# Altium schematic symbol library jlcpcb_2025_04_resistors_extended_2512.schlib: 2667 symbols (part 9 of 14) (continued)
## RC2512FK-7W33RL
designator R?  Resistance: 33Ω  (hidden comment: *)
Resistor, 33Ω, ±1%, 2W, 200V, ±200ppm/℃, -55℃~+155℃, SMD 2512; Manufacturer: Uniroyal; Manufacturer Part Number: RC2512FK-7W33RL; Supplier 1: LCSC; Supplier Part Number 1: C723367; JLCPCB Part Number: C723367; Power Rating: 2W; Category: Resistors; Package Size: 2512; JLCPCB Basic Part: Yes; Tolerance: ±1%; Voltage Rating: 200V; Temperature Coefficient: ±200ppm/℃; Temperature Rating: -55℃~+155℃; ComponentLink1Description: Datasheet; ComponentLink1URL: https://wmsc.lcsc.com/wmsc/upload/file/pdf/v2/lcsc/2008171304_YAGEO-RC2512FK-7W33RL_C723367.pdf; ComponentLink2Description: JLCPCB Part URL; ComponentLink2URL: https://jlcpcb.com/partdetail/C723367
pins: 1, 2
1 alternate drawing of the same symbol

## RC2512FK-7W49R9L
designator R?  Resistance: 49.9Ω  (hidden comment: *)
Resistor, 49.9Ω, ±1%, 2W, ±100ppm/℃, -55℃~+155℃, SMD 2512; Manufacturer: Uniroyal; Manufacturer Part Number: RC2512FK-7W49R9L; Supplier 1: LCSC; Supplier Part Number 1: C723714; JLCPCB Part Number: C723714; Power Rating: 2W; Category: Resistors; Package Size: 2512; JLCPCB Basic Part: Yes; Tolerance: ±1%; Temperature Coefficient: ±100ppm/℃; Temperature Rating: -55℃~+155℃; ComponentLink1Description: Datasheet; ComponentLink1URL: https://wmsc.lcsc.com/wmsc/upload/file/pdf/v2/lcsc/2008171337_YAGEO-RC2512FK-7W49R9L_C723714.pdf; ComponentLink2Description: JLCPCB Part URL; ComponentLink2URL: https://jlcpcb.com/partdetail/C723714
pins: 1, 2
1 alternate drawing of the same symbol

## RC2512FK-7W51RL
designator R?  Resistance: 51Ω  (hidden comment: *)
Resistor, 51Ω, ±1%, 2W, 200V, ±100ppm/℃, -55℃~+155℃, SMD 2512; Manufacturer: Uniroyal; Manufacturer Part Number: RC2512FK-7W51RL; Supplier 1: LCSC; Supplier Part Number 1: C326579; JLCPCB Part Number: C326579; Power Rating: 2W; Category: Resistors; Package Size: 2512; JLCPCB Basic Part: Yes; Tolerance: ±1%; Voltage Rating: 200V; Temperature Coefficient: ±100ppm/℃; Temperature Rating: -55℃~+155℃; ComponentLink1Description: Datasheet; ComponentLink1URL: https://wmsc.lcsc.com/wmsc/upload/file/pdf/v2/lcsc/1811141450_YAGEO-RC2512FK-7W51RL_C326579.pdf; ComponentLink2Description: JLCPCB Part URL; ComponentLink2URL: https://jlcpcb.com/partdetail/C326579
pins: 1, 2
1 alternate drawing of the same symbol

## RC2512FK-7W91RL
designator R?  Resistance: 91Ω  (hidden comment: *)
Resistor, 91Ω, ±1%, 2W, ±100ppm/℃, -55℃~+155℃, SMD 2512; Manufacturer: Uniroyal; Manufacturer Part Number: RC2512FK-7W91RL; Supplier 1: LCSC; Supplier Part Number 1: C723627; JLCPCB Part Number: C723627; Power Rating: 2W; Category: Resistors; Package Size: 2512; JLCPCB Basic Part: Yes; Tolerance: ±1%; Temperature Coefficient: ±100ppm/℃; Temperature Rating: -55℃~+155℃; ComponentLink1Description: Datasheet; ComponentLink1URL: https://wmsc.lcsc.com/wmsc/upload/file/pdf/v2/lcsc/2008201236_YAGEO-RC2512FK-7W91RL_C723627.pdf; ComponentLink2Description: JLCPCB Part URL; ComponentLink2URL: https://jlcpcb.com/partdetail/C723627
pins: 1, 2
1 alternate drawing of the same symbol

## RC2512FK-7W100KL
designator R?  Resistance: 100kΩ  (hidden comment: *)
Resistor, 100kΩ, ±1%, 2W, ±200ppm/℃, -55℃~+155℃, SMD 2512; Manufacturer: Uniroyal; Manufacturer Part Number: RC2512FK-7W100KL; Supplier 1: LCSC; Supplier Part Number 1: C6170372; JLCPCB Part Number: C6170372; Power Rating: 2W; Category: Resistors; Package Size: 2512; JLCPCB Basic Part: Yes; Tolerance: ±1%; Temperature Coefficient: ±200ppm/℃; Temperature Rating: -55℃~+155℃; ComponentLink1Description: Datasheet; ComponentLink1URL: https://wmsc.lcsc.com/wmsc/upload/file/pdf/v2/lcsc/2312081307_YAGEO-RC2512FK-7W100KL_C6170372.pdf; ComponentLink2Description: JLCPCB Part URL; ComponentLink2URL: https://jlcpcb.com/partdetail/C6170372
pins: 1, 2
1 alternate drawing of the same symbol

## RC2512FK-071K2L
designator R?  Resistance: 1.2kΩ  (hidden comment: *)
Resistor, 1.2kΩ, ±1%, 1W, 200V, ±100ppm/℃, -55℃~+155℃, SMD 2512; Manufacturer: Uniroyal; Manufacturer Part Number: RC2512FK-071K2L; Supplier 1: LCSC; Supplier Part Number 1: C877804; JLCPCB Part Number: C877804; Power Rating: 1W; Category: Resistors; Package Size: 2512; JLCPCB Basic Part: Yes; Tolerance: ±1%; Voltage Rating: 200V; Temperature Coefficient: ±100ppm/℃; Temperature Rating: -55℃~+155℃; ComponentLink1Description: Datasheet; ComponentLink1URL: https://wmsc.lcsc.com/wmsc/upload/file/pdf/v2/lcsc/2112231430_YAGEO-RC2512FK-071K2L_C877804.pdf; ComponentLink2Description: JLCPCB Part URL; ComponentLink2URL: https://jlcpcb.com/partdetail/C877804
pins: 1, 2
1 alternate drawing of the same symbol

## RC2512FK-071K4L
designator R?  Resistance: 1.4kΩ  (hidden comment: *)
Resistor, 1.4kΩ, ±1%, 1W, 200V, ±100ppm/℃, -55℃~+155℃, SMD 2512; Manufacturer: Uniroyal; Manufacturer Part Number: RC2512FK-071K4L; Supplier 1: LCSC; Supplier Part Number 1: C877810; JLCPCB Part Number: C877810; Power Rating: 1W; Category: Resistors; Package Size: 2512; JLCPCB Basic Part: Yes; Tolerance: ±1%; Voltage Rating: 200V; Temperature Coefficient: ±100ppm/℃; Temperature Rating: -55℃~+155℃; ComponentLink1Description: Datasheet; ComponentLink1URL: https://wmsc.lcsc.com/wmsc/upload/file/pdf/v2/lcsc/2202251630_YAGEO-RC2512FK-071K4L_C877810.pdf; ComponentLink2Description: JLCPCB Part URL; ComponentLink2URL: https://jlcpcb.com/partdetail/C877810
pins: 1, 2
1 alternate drawing of the same symbol

## RC2512FK-071K5L
designator R?  Resistance: 1.5kΩ  (hidden comment: *)
Resistor, 1.5kΩ, ±1%, 1W, 200V, ±100ppm/℃, -55℃~+155℃, SMD 2512; Manufacturer: Uniroyal; Manufacturer Part Number: RC2512FK-071K5L; Supplier 1: LCSC; Supplier Part Number 1: C276334; JLCPCB Part Number: C276334; Power Rating: 1W; Category: Resistors; Package Size: 2512; JLCPCB Basic Part: Yes; Tolerance: ±1%; Voltage Rating: 200V; Temperature Coefficient: ±100ppm/℃; Temperature Rating: -55℃~+155℃; ComponentLink1Description: Datasheet; ComponentLink1URL: https://wmsc.lcsc.com/wmsc/upload/file/pdf/v2/lcsc/2304140030_YAGEO-RC2512FK-071K5L_C276334.pdf; ComponentLink2Description: JLCPCB Part URL; ComponentLink2URL: https://jlcpcb.com/partdetail/C276334
pins: 1, 2
1 alternate drawing of the same symbol

## RC2512FK-071ML
designator R?  Resistance: 1MΩ  (hidden comment: *)
Resistor, 1MΩ, ±1%, 1W, 200V, ±100ppm/℃, -55℃~+155℃, SMD 2512; Manufacturer: Uniroyal; Manufacturer Part Number: RC2512FK-071ML; Supplier 1: LCSC; Supplier Part Number 1: C276335; JLCPCB Part Number: C276335; Power Rating: 1W; Category: Resistors; Package Size: 2512; JLCPCB Basic Part: Yes; Tolerance: ±1%; Voltage Rating: 200V; Temperature Coefficient: ±100ppm/℃; Temperature Rating: -55℃~+155℃; ComponentLink1Description: Datasheet; ComponentLink1URL: https://wmsc.lcsc.com/wmsc/upload/file/pdf/v2/lcsc/2304140030_YAGEO-RC2512FK-071ML_C276335.pdf; ComponentLink2Description: JLCPCB Part URL; ComponentLink2URL: https://jlcpcb.com/partdetail/C276335
pins: 1, 2
1 alternate drawing of the same symbol

## RC2512FK-071R1L
designator R?  Resistance: 1.1Ω  (hidden comment: *)
Resistor, 1.1Ω, ±1%, 1W, ±200ppm/℃, -55℃~+155℃, SMD 2512; Manufacturer: Uniroyal; Manufacturer Part Number: RC2512FK-071R1L; Supplier 1: LCSC; Supplier Part Number 1: C877832; JLCPCB Part Number: C877832; Power Rating: 1W; Category: Resistors; Package Size: 2512; JLCPCB Basic Part: Yes; Tolerance: ±1%; Temperature Coefficient: ±200ppm/℃; Temperature Rating: -55℃~+155℃; ComponentLink1Description: Datasheet; ComponentLink1URL: https://wmsc.lcsc.com/wmsc/upload/file/pdf/v2/lcsc/2210202330_YAGEO-RC2512FK-071R1L_C877832.pdf; ComponentLink2Description: JLCPCB Part URL; ComponentLink2URL: https://jlcpcb.com/partdetail/C877832
pins: 1, 2
1 alternate drawing of the same symbol

## RC2512FK-071R2L
designator R?  Resistance: 1.2Ω  (hidden comment: *)
Resistor, 1.2Ω, ±1%, 1W, 200V, ±200ppm/℃, -55℃~+155℃, SMD 2512; Manufacturer: Uniroyal; Manufacturer Part Number: RC2512FK-071R2L; Supplier 1: LCSC; Supplier Part Number 1: C877834; JLCPCB Part Number: C877834; Power Rating: 1W; Category: Resistors; Package Size: 2512; JLCPCB Basic Part: Yes; Tolerance: ±1%; Voltage Rating: 200V; Temperature Coefficient: ±200ppm/℃; Temperature Rating: -55℃~+155℃; ComponentLink1Description: Datasheet; ComponentLink1URL: https://wmsc.lcsc.com/wmsc/upload/file/pdf/v2/lcsc/2304140030_YAGEO-RC2512FK-071R2L_C877834.pdf; ComponentLink2Description: JLCPCB Part URL; ComponentLink2URL: https://jlcpcb.com/partdetail/C877834
pins: 1, 2
1 alternate drawing of the same symbol

## RC2512FK-071R5L
designator R?  Resistance: 1.5Ω  (hidden comment: *)
Resistor, 1.5Ω, ±1%, 1W, 200V, ±200ppm/℃, -55℃~+155℃, SMD 2512; Manufacturer: Uniroyal; Manufacturer Part Number: RC2512FK-071R5L; Supplier 1: LCSC; Supplier Part Number 1: C181757; JLCPCB Part Number: C181757; Power Rating: 1W; Category: Resistors; Package Size: 2512; JLCPCB Basic Part: Yes; Tolerance: ±1%; Voltage Rating: 200V; Temperature Coefficient: ±200ppm/℃; Temperature Rating: -55℃~+155℃; ComponentLink1Description: Datasheet; ComponentLink1URL: https://wmsc.lcsc.com/wmsc/upload/file/pdf/v2/lcsc/1810271823_YAGEO-RC2512FK-071R5L_C181757.pdf; ComponentLink2Description: JLCPCB Part URL; ComponentLink2URL: https://jlcpcb.com/partdetail/C181757
pins: 1, 2
1 alternate drawing of the same symbol

## RC2512FK-071RL
designator R?  Resistance: 1Ω  (hidden comment: *)
Resistor, 1Ω, ±1%, 1W, 200V, ±200ppm/℃, -55℃~+155℃, SMD 2512; Manufacturer: Uniroyal; Manufacturer Part Number: RC2512FK-071RL; Supplier 1: LCSC; Supplier Part Number 1: C181756; JLCPCB Part Number: C181756; Power Rating: 1W; Category: Resistors; Package Size: 2512; JLCPCB Basic Part: Yes; Tolerance: ±1%; Voltage Rating: 200V; Temperature Coefficient: ±200ppm/℃; Temperature Rating: -55℃~+155℃; ComponentLink1Description: Datasheet; ComponentLink1URL: https://wmsc.lcsc.com/wmsc/upload/file/pdf/v2/lcsc/2304140030_YAGEO-RC2512FK-071RL_C181756.pdf; ComponentLink2Description: JLCPCB Part URL; ComponentLink2URL: https://jlcpcb.com/partdetail/C181756
pins: 1, 2
1 alternate drawing of the same symbol

## RC2512FK-072K7L
designator R?  Resistance: 2.7kΩ  (hidden comment: *)
Resistor, 2.7kΩ, ±1%, 1W, 200V, ±100ppm/℃, -55℃~+155℃, SMD 2512; Manufacturer: Uniroyal; Manufacturer Part Number: RC2512FK-072K7L; Supplier 1: LCSC; Supplier Part Number 1: C877933; JLCPCB Part Number: C877933; Power Rating: 1W; Category: Resistors; Package Size: 2512; JLCPCB Basic Part: Yes; Tolerance: ±1%; Voltage Rating: 200V; Temperature Coefficient: ±100ppm/℃; Temperature Rating: -55℃~+155℃; ComponentLink1Description: Datasheet; ComponentLink1URL: https://wmsc.lcsc.com/wmsc/upload/file/pdf/v2/lcsc/2201101800_YAGEO-RC2512FK-072K7L_C877933.pdf; ComponentLink2Description: JLCPCB Part URL; ComponentLink2URL: https://jlcpcb.com/partdetail/C877933
pins: 1, 2
1 alternate drawing of the same symbol

## RC2512FK-072KL
designator R?  Resistance: 2kΩ  (hidden comment: *)
Resistor, 2kΩ, ±1%, 1W, 200V, ±100ppm/℃, -55℃~+155℃, SMD 2512; Manufacturer: Uniroyal; Manufacturer Part Number: RC2512FK-072KL; Supplier 1: LCSC; Supplier Part Number 1: C276337; JLCPCB Part Number: C276337; Power Rating: 1W; Category: Resistors; Package Size: 2512; JLCPCB Basic Part: Yes; Tolerance: ±1%; Voltage Rating: 200V; Temperature Coefficient: ±100ppm/℃; Temperature Rating: -55℃~+155℃; ComponentLink1Description: Datasheet; ComponentLink1URL: https://wmsc.lcsc.com/wmsc/upload/file/pdf/v2/lcsc/2304140030_YAGEO-RC2512FK-072KL_C276337.pdf; ComponentLink2Description: JLCPCB Part URL; ComponentLink2URL: https://jlcpcb.com/partdetail/C276337
pins: 1, 2
1 alternate drawing of the same symbol

## RC2512FK-072ML
designator R?  Resistance: 2MΩ  (hidden comment: *)
Resistor, 2MΩ, ±1%, 1W, 200V, ±100ppm/℃, -55℃~+155℃, SMD 2512; Manufacturer: Uniroyal; Manufacturer Part Number: RC2512FK-072ML; Supplier 1: LCSC; Supplier Part Number 1: C723722; JLCPCB Part Number: C723722; Power Rating: 1W; Category: Resistors; Package Size: 2512; JLCPCB Basic Part: Yes; Tolerance: ±1%; Voltage Rating: 200V; Temperature Coefficient: ±100ppm/℃; Temperature Rating: -55℃~+155℃; ComponentLink1Description: Datasheet; ComponentLink1URL: https://wmsc.lcsc.com/wmsc/upload/file/pdf/v2/lcsc/2008171337_YAGEO-RC2512FK-072ML_C723722.pdf; ComponentLink2Description: JLCPCB Part URL; ComponentLink2URL: https://jlcpcb.com/partdetail/C723722
pins: 1, 2
1 alternate drawing of the same symbol

## RC2512FK-072R2L
designator R?  Resistance: 2.2Ω  (hidden comment: *)
Resistor, 2.2Ω, ±1%, 1W, 200V, ±200ppm/℃, -55℃~+155℃, SMD 2512; Manufacturer: Uniroyal; Manufacturer Part Number: RC2512FK-072R2L; Supplier 1: LCSC; Supplier Part Number 1: C137028; JLCPCB Part Number: C137028; Power Rating: 1W; Category: Resistors; Package Size: 2512; JLCPCB Basic Part: Yes; Tolerance: ±1%; Voltage Rating: 200V; Temperature Coefficient: ±200ppm/℃; Temperature Rating: -55℃~+155℃; ComponentLink1Description: Datasheet; ComponentLink1URL: https://wmsc.lcsc.com/wmsc/upload/file/pdf/v2/lcsc/2304140030_YAGEO-RC2512FK-072R2L_C137028.pdf; ComponentLink2Description: JLCPCB Part URL; ComponentLink2URL: https://jlcpcb.com/partdetail/C137028
pins: 1, 2
1 alternate drawing of the same symbol

## RC2512FK-072R4L
designator R?  Resistance: 2.4Ω  (hidden comment: *)
Resistor, 2.4Ω, ±1%, 1W, 200V, ±200ppm/℃, -55℃~+155℃, SMD 2512; Manufacturer: Uniroyal; Manufacturer Part Number: RC2512FK-072R4L; Supplier 1: LCSC; Supplier Part Number 1: C326564; JLCPCB Part Number: C326564; Power Rating: 1W; Category: Resistors; Package Size: 2512; JLCPCB Basic Part: Yes; Tolerance: ±1%; Voltage Rating: 200V; Temperature Coefficient: ±200ppm/℃; Temperature Rating: -55℃~+155℃; ComponentLink1Description: Datasheet; ComponentLink1URL: https://wmsc.lcsc.com/wmsc/upload/file/pdf/v2/lcsc/1811141450_YAGEO-RC2512FK-072R4L_C326564.pdf; ComponentLink2Description: JLCPCB Part URL; ComponentLink2URL: https://jlcpcb.com/partdetail/C326564
pins: 1, 2
1 alternate drawing of the same symbol

## RC2512FK-072RL
designator R?  Resistance: 2Ω  (hidden comment: *)
Resistor, 2Ω, ±1%, 1W, 200V, ±200ppm/℃, -55℃~+155℃, SMD 2512; Manufacturer: Uniroyal; Manufacturer Part Number: RC2512FK-072RL; Supplier 1: LCSC; Supplier Part Number 1: C136027; JLCPCB Part Number: C136027; Power Rating: 1W; Category: Resistors; Package Size: 2512; JLCPCB Basic Part: Yes; Tolerance: ±1%; Voltage Rating: 200V; Temperature Coefficient: ±200ppm/℃; Temperature Rating: -55℃~+155℃; ComponentLink1Description: Datasheet; ComponentLink1URL: https://wmsc.lcsc.com/wmsc/upload/file/pdf/v2/lcsc/2304140030_YAGEO-RC2512FK-072RL_C136027.pdf; ComponentLink2Description: JLCPCB Part URL; ComponentLink2URL: https://jlcpcb.com/partdetail/C136027
pins: 1, 2
1 alternate drawing of the same symbol

## RC2512FK-073K3L
designator R?  Resistance: 3.3kΩ  (hidden comment: *)
Resistor, 3.3kΩ, ±1%, 1W, 200V, ±100ppm/℃, -55℃~+155℃, SMD 2512; Manufacturer: Uniroyal; Manufacturer Part Number: RC2512FK-073K3L; Supplier 1: LCSC; Supplier Part Number 1: C326620; JLCPCB Part Number: C326620; Power Rating: 1W; Category: Resistors; Package Size: 2512; JLCPCB Basic Part: Yes; Tolerance: ±1%; Voltage Rating: 200V; Temperature Coefficient: ±100ppm/℃; Temperature Rating: -55℃~+155℃; ComponentLink1Description: Datasheet; ComponentLink1URL: https://wmsc.lcsc.com/wmsc/upload/file/pdf/v2/lcsc/1811141450_YAGEO-RC2512FK-073K3L_C326620.pdf; ComponentLink2Description: JLCPCB Part URL; ComponentLink2URL: https://jlcpcb.com/partdetail/C326620
pins: 1, 2
1 alternate drawing of the same symbol

## RC2512FK-073K9L
designator R?  Resistance: 3.9kΩ  (hidden comment: *)
Resistor, 3.9kΩ, ±1%, 1W, 200V, ±100ppm/℃, -55℃~+155℃, SMD 2512; Manufacturer: Uniroyal; Manufacturer Part Number: RC2512FK-073K9L; Supplier 1: LCSC; Supplier Part Number 1: C326613; JLCPCB Part Number: C326613; Power Rating: 1W; Category: Resistors; Package Size: 2512; JLCPCB Basic Part: Yes; Tolerance: ±1%; Voltage Rating: 200V; Temperature Coefficient: ±100ppm/℃; Temperature Rating: -55℃~+155℃; ComponentLink1Description: Datasheet; ComponentLink1URL: https://wmsc.lcsc.com/wmsc/upload/file/pdf/v2/lcsc/1811141450_YAGEO-RC2512FK-073K9L_C326613.pdf; ComponentLink2Description: JLCPCB Part URL; ComponentLink2URL: https://jlcpcb.com/partdetail/C326613
pins: 1, 2
1 alternate drawing of the same symbol

## RC2512FK-073K32L
designator R?  Resistance: 3.32kΩ  (hidden comment: *)
Resistor, 3.32kΩ, ±1%, 1W, ±100ppm/℃, -55℃~+155℃, SMD 2512; Manufacturer: Uniroyal; Manufacturer Part Number: RC2512FK-073K32L; Supplier 1: LCSC; Supplier Part Number 1: C878008; JLCPCB Part Number: C878008; Power Rating: 1W; Category: Resistors; Package Size: 2512; JLCPCB Basic Part: Yes; Tolerance: ±1%; Temperature Coefficient: ±100ppm/℃; Temperature Rating: -55℃~+155℃; ComponentLink1Description: Datasheet; ComponentLink1URL: https://wmsc.lcsc.com/wmsc/upload/file/pdf/v2/lcsc/2210201700_YAGEO-RC2512FK-073K32L_C878008.pdf; ComponentLink2Description: JLCPCB Part URL; ComponentLink2URL: https://jlcpcb.com/partdetail/C878008
pins: 1, 2
1 alternate drawing of the same symbol

## RC2512FK-073R3L
designator R?  Resistance: 3.3Ω  (hidden comment: *)
Resistor, 3.3Ω, ±1%, 1W, 200V, ±200ppm/℃, -55℃~+155℃, SMD 2512; Manufacturer: Uniroyal; Manufacturer Part Number: RC2512FK-073R3L; Supplier 1: LCSC; Supplier Part Number 1: C513649; JLCPCB Part Number: C513649; Power Rating: 1W; Category: Resistors; Package Size: 2512; JLCPCB Basic Part: Yes; Tolerance: ±1%; Voltage Rating: 200V; Temperature Coefficient: ±200ppm/℃; Temperature Rating: -55℃~+155℃; ComponentLink1Description: Datasheet; ComponentLink1URL: https://wmsc.lcsc.com/wmsc/upload/file/pdf/v2/lcsc/2304140030_YAGEO-RC2512FK-073R3L_C513649.pdf; ComponentLink2Description: JLCPCB Part URL; ComponentLink2URL: https://jlcpcb.com/partdetail/C513649
pins: 1, 2
1 alternate drawing of the same symbol

## RC2512FK-073R9L
designator R?  Resistance: 3.9Ω  (hidden comment: *)
Resistor, 3.9Ω, ±1%, 1W, 200V, ±200ppm/℃, -55℃~+155℃, SMD 2512; Manufacturer: Uniroyal; Manufacturer Part Number: RC2512FK-073R9L; Supplier 1: LCSC; Supplier Part Number 1: C326563; JLCPCB Part Number: C326563; Power Rating: 1W; Category: Resistors; Package Size: 2512; JLCPCB Basic Part: Yes; Tolerance: ±1%; Voltage Rating: 200V; Temperature Coefficient: ±200ppm/℃; Temperature Rating: -55℃~+155℃; ComponentLink1Description: Datasheet; ComponentLink1URL: https://wmsc.lcsc.com/wmsc/upload/file/pdf/v2/lcsc/1811141444_YAGEO-RC2512FK-073R9L_C326563.pdf; ComponentLink2Description: JLCPCB Part URL; ComponentLink2URL: https://jlcpcb.com/partdetail/C326563
pins: 1, 2
1 alternate drawing of the same symbol

## RC2512FK-073R57L
designator R?  Resistance: 3.57Ω  (hidden comment: *)
Resistor, 3.57Ω, ±1%, 1W, 200V, ±200ppm/℃, -55℃~+155℃, SMD 2512; Manufacturer: Uniroyal; Manufacturer Part Number: RC2512FK-073R57L; Supplier 1: LCSC; Supplier Part Number 1: C326562; JLCPCB Part Number: C326562; Power Rating: 1W; Category: Resistors; Package Size: 2512; JLCPCB Basic Part: Yes; Tolerance: ±1%; Voltage Rating: 200V; Temperature Coefficient: ±200ppm/℃; Temperature Rating: -55℃~+155℃; ComponentLink1Description: Datasheet; ComponentLink1URL: https://wmsc.lcsc.com/wmsc/upload/file/pdf/v2/lcsc/1811141450_YAGEO-RC2512FK-073R57L_C326562.pdf; ComponentLink2Description: JLCPCB Part URL; ComponentLink2URL: https://jlcpcb.com/partdetail/C326562
pins: 1, 2
1 alternate drawing of the same symbol

## RC2512FK-073RL
designator R?  Resistance: 3Ω  (hidden comment: *)
Resistor, 3Ω, ±1%, 1W, 200V, ±200ppm/℃, -55℃~+155℃, SMD 2512; Manufacturer: Uniroyal; Manufacturer Part Number: RC2512FK-073RL; Supplier 1: LCSC; Supplier Part Number 1: C163340; JLCPCB Part Number: C163340; Power Rating: 1W; Category: Resistors; Package Size: 2512; JLCPCB Basic Part: Yes; Tolerance: ±1%; Voltage Rating: 200V; Temperature Coefficient: ±200ppm/℃; Temperature Rating: -55℃~+155℃; ComponentLink1Description: Datasheet; ComponentLink1URL: https://wmsc.lcsc.com/wmsc/upload/file/pdf/v2/lcsc/2304140030_YAGEO-RC2512FK-073RL_C163340.pdf; ComponentLink2Description: JLCPCB Part URL; ComponentLink2URL: https://jlcpcb.com/partdetail/C163340
pins: 1, 2
1 alternate drawing of the same symbol

## RC2512FK-074K7L
designator R?  Resistance: 4.7kΩ  (hidden comment: *)
Resistor, 4.7kΩ, ±1%, 1W, 200V, ±100ppm/℃, -55℃~+155℃, SMD 2512; Manufacturer: Uniroyal; Manufacturer Part Number: RC2512FK-074K7L; Supplier 1: LCSC; Supplier Part Number 1: C163339; JLCPCB Part Number: C163339; Power Rating: 1W; Category: Resistors; Package Size: 2512; JLCPCB Basic Part: Yes; Tolerance: ±1%; Voltage Rating: 200V; Temperature Coefficient: ±100ppm/℃; Temperature Rating: -55℃~+155℃; ComponentLink1Description: Datasheet; ComponentLink1URL: https://wmsc.lcsc.com/wmsc/upload/file/pdf/v2/lcsc/2304140030_YAGEO-RC2512FK-074K7L_C163339.pdf; ComponentLink2Description: JLCPCB Part URL; ComponentLink2URL: https://jlcpcb.com/partdetail/C163339
pins: 1, 2
1 alternate drawing of the same symbol

## RC2512FK-074R99L
designator R?  Resistance: 4.99Ω  (hidden comment: *)
Resistor, 4.99Ω, ±1%, 1W, 200V, ±200ppm/℃, -55℃~+155℃, SMD 2512; Manufacturer: Uniroyal; Manufacturer Part Number: RC2512FK-074R99L; Supplier 1: LCSC; Supplier Part Number 1: C137023; JLCPCB Part Number: C137023; Power Rating: 1W; Category: Resistors; Package Size: 2512; JLCPCB Basic Part: Yes; Tolerance: ±1%; Voltage Rating: 200V; Temperature Coefficient: ±200ppm/℃; Temperature Rating: -55℃~+155℃; ComponentLink1Description: Datasheet; ComponentLink1URL: https://wmsc.lcsc.com/wmsc/upload/file/pdf/v2/lcsc/2304140030_YAGEO-RC2512FK-074R99L_C137023.pdf; ComponentLink2Description: JLCPCB Part URL; ComponentLink2URL: https://jlcpcb.com/partdetail/C137023
pins: 1, 2
1 alternate drawing of the same symbol

## RC2512FK-075K1L
designator R?  Resistance: 5.1kΩ  (hidden comment: *)
Resistor, 5.1kΩ, ±1%, 1W, ±100ppm/℃, -55℃~+155℃, SMD 2512; Manufacturer: Uniroyal; Manufacturer Part Number: RC2512FK-075K1L; Supplier 1: LCSC; Supplier Part Number 1: C878128; JLCPCB Part Number: C878128; Power Rating: 1W; Category: Resistors; Package Size: 2512; JLCPCB Basic Part: Yes; Tolerance: ±1%; Temperature Coefficient: ±100ppm/℃; Temperature Rating: -55℃~+155℃; ComponentLink1Description: Datasheet; ComponentLink1URL: https://wmsc.lcsc.com/wmsc/upload/file/pdf/v2/lcsc/2101211834_YAGEO-RC2512FK-075K1L_C878128.pdf; ComponentLink2Description: JLCPCB Part URL; ComponentLink2URL: https://jlcpcb.com/partdetail/C878128
pins: 1, 2
1 alternate drawing of the same symbol

## RC2512FK-075K6L
designator R?  Resistance: 5.6kΩ  (hidden comment: *)
Resistor, 5.6kΩ, ±1%, 1W, 200V, ±100ppm/℃, -55℃~+155℃, SMD 2512; Manufacturer: Uniroyal; Manufacturer Part Number: RC2512FK-075K6L; Supplier 1: LCSC; Supplier Part Number 1: C878133; JLCPCB Part Number: C878133; Power Rating: 1W; Category: Resistors; Package Size: 2512; JLCPCB Basic Part: Yes; Tolerance: ±1%; Voltage Rating: 200V; Temperature Coefficient: ±100ppm/℃; Temperature Rating: -55℃~+155℃; ComponentLink1Description: Datasheet; ComponentLink1URL: https://wmsc.lcsc.com/wmsc/upload/file/pdf/v2/lcsc/2112131830_YAGEO-RC2512FK-075K6L_C878133.pdf; ComponentLink2Description: JLCPCB Part URL; ComponentLink2URL: https://jlcpcb.com/partdetail/C878133
pins: 1, 2
1 alternate drawing of the same symbol

## RC2512FK-075R1L
designator R?  Resistance: 5.1Ω  (hidden comment: *)
Resistor, 5.1Ω, ±1%, 1W, 200V, ±200ppm/℃, -55℃~+155℃, SMD 2512; Manufacturer: Uniroyal; Manufacturer Part Number: RC2512FK-075R1L; Supplier 1: LCSC; Supplier Part Number 1: C137019; JLCPCB Part Number: C137019; Power Rating: 1W; Category: Resistors; Package Size: 2512; JLCPCB Basic Part: Yes; Tolerance: ±1%; Voltage Rating: 200V; Temperature Coefficient: ±200ppm/℃; Temperature Rating: -55℃~+155℃; ComponentLink1Description: Datasheet; ComponentLink1URL: https://wmsc.lcsc.com/wmsc/upload/file/pdf/v2/lcsc/2304140030_YAGEO-RC2512FK-075R1L_C137019.pdf; ComponentLink2Description: JLCPCB Part URL; ComponentLink2URL: https://jlcpcb.com/partdetail/C137019
pins: 1, 2
1 alternate drawing of the same symbol

## RC2512FK-075R6L
designator R?  Resistance: 5.6Ω  (hidden comment: *)
Resistor, 5.6Ω, ±1%, 1W, 200V, ±200ppm/℃, -55℃~+155℃, SMD 2512; Manufacturer: Uniroyal; Manufacturer Part Number: RC2512FK-075R6L; Supplier 1: LCSC; Supplier Part Number 1: C705465; JLCPCB Part Number: C705465; Power Rating: 1W; Category: Resistors; Package Size: 2512; JLCPCB Basic Part: Yes; Tolerance: ±1%; Voltage Rating: 200V; Temperature Coefficient: ±200ppm/℃; Temperature Rating: -55℃~+155℃; ComponentLink1Description: Datasheet; ComponentLink1URL: https://wmsc.lcsc.com/wmsc/upload/file/pdf/v2/lcsc/2304140030_YAGEO-RC2512FK-075R6L_C705465.pdf; ComponentLink2Description: JLCPCB Part URL; ComponentLink2URL: https://jlcpcb.com/partdetail/C705465
pins: 1, 2
1 alternate drawing of the same symbol

## RC2512FK-077K5L
designator R?  Resistance: 7.5kΩ  (hidden comment: *)
Resistor, 7.5kΩ, ±1%, 1W, 200V, ±100ppm/℃, -55℃~+155℃, SMD 2512; Manufacturer: Uniroyal; Manufacturer Part Number: RC2512FK-077K5L; Supplier 1: LCSC; Supplier Part Number 1: C724016; JLCPCB Part Number: C724016; Power Rating: 1W; Category: Resistors; Package Size: 2512; JLCPCB Basic Part: Yes; Tolerance: ±1%; Voltage Rating: 200V; Temperature Coefficient: ±100ppm/℃; Temperature Rating: -55℃~+155℃; ComponentLink1Description: Datasheet; ComponentLink1URL: https://wmsc.lcsc.com/wmsc/upload/file/pdf/v2/lcsc/2009261810_YAGEO-RC2512FK-077K5L_C724016.pdf; ComponentLink2Description: JLCPCB Part URL; ComponentLink2URL: https://jlcpcb.com/partdetail/C724016
pins: 1, 2
1 alternate drawing of the same symbol

## RC2512FK-0710RL
designator R?  Resistance: 10Ω  (hidden comment: *)
Resistor, 10Ω, ±1%, 1W, 200V, ±200ppm/℃, -55℃~+155℃, SMD 2512; Manufacturer: Uniroyal; Manufacturer Part Number: RC2512FK-0710RL; Supplier 1: LCSC; Supplier Part Number 1: C137032; JLCPCB Part Number: C137032; Power Rating: 1W; Category: Resistors; Package Size: 2512; JLCPCB Basic Part: Yes; Tolerance: ±1%; Voltage Rating: 200V; Temperature Coefficient: ±200ppm/℃; Temperature Rating: -55℃~+155℃; ComponentLink1Description: Datasheet; ComponentLink1URL: https://wmsc.lcsc.com/wmsc/upload/file/pdf/v2/lcsc/2304140030_YAGEO-RC2512FK-0710RL_C137032.pdf; ComponentLink2Description: JLCPCB Part URL; ComponentLink2URL: https://jlcpcb.com/partdetail/C137032
pins: 1, 2
1 alternate drawing of the same symbol

## RC2512FK-0715RL
designator R?  Resistance: 15Ω  (hidden comment: *)
Resistor, 15Ω, ±1%, 1W, 200V, ±100ppm/℃, -55℃~+155℃, SMD 2512; Manufacturer: Uniroyal; Manufacturer Part Number: RC2512FK-0715RL; Supplier 1: LCSC; Supplier Part Number 1: C877752; JLCPCB Part Number: C877752; Power Rating: 1W; Category: Resistors; Package Size: 2512; JLCPCB Basic Part: Yes; Tolerance: ±1%; Voltage Rating: 200V; Temperature Coefficient: ±100ppm/℃; Temperature Rating: -55℃~+155℃; ComponentLink1Description: Datasheet; ComponentLink1URL: https://wmsc.lcsc.com/wmsc/upload/file/pdf/v2/lcsc/2203031730_YAGEO-RC2512FK-0715RL_C877752.pdf; ComponentLink2Description: JLCPCB Part URL; ComponentLink2URL: https://jlcpcb.com/partdetail/C877752
pins: 1, 2
1 alternate drawing of the same symbol

## RC2512FK-0718R7L
designator R?  Resistance: 18.7Ω  (hidden comment: *)
Resistor, 18.7Ω, ±1%, 1W, 200V, ±100ppm/℃, -55℃~+155℃, SMD 2512; Manufacturer: Uniroyal; Manufacturer Part Number: RC2512FK-0718R7L; Supplier 1: LCSC; Supplier Part Number 1: C326612; JLCPCB Part Number: C326612; Power Rating: 1W; Category: Resistors; Package Size: 2512; JLCPCB Basic Part: Yes; Tolerance: ±1%; Voltage Rating: 200V; Temperature Coefficient: ±100ppm/℃; Temperature Rating: -55℃~+155℃; ComponentLink1Description: Datasheet; ComponentLink1URL: https://wmsc.lcsc.com/wmsc/upload/file/pdf/v2/lcsc/1811141450_YAGEO-RC2512FK-0718R7L_C326612.pdf; ComponentLink2Description: JLCPCB Part URL; ComponentLink2URL: https://jlcpcb.com/partdetail/C326612
pins: 1, 2
1 alternate drawing of the same symbol

## RC2512FK-0718RL
designator R?  Resistance: 18Ω  (hidden comment: *)
Resistor, 18Ω, ±1%, 1W, ±100ppm/℃, -55℃~+155℃, SMD 2512; Manufacturer: Uniroyal; Manufacturer Part Number: RC2512FK-0718RL; Supplier 1: LCSC; Supplier Part Number 1: C877785; JLCPCB Part Number: C877785; Power Rating: 1W; Category: Resistors; Package Size: 2512; JLCPCB Basic Part: Yes; Tolerance: ±1%; Temperature Coefficient: ±100ppm/℃; Temperature Rating: -55℃~+155℃; ComponentLink1Description: Datasheet; ComponentLink1URL: https://wmsc.lcsc.com/wmsc/upload/file/pdf/v2/lcsc/2311211102_YAGEO-RC2512FK-0718RL_C877785.pdf; ComponentLink2Description: JLCPCB Part URL; ComponentLink2URL: https://jlcpcb.com/partdetail/C877785
pins: 1, 2
1 alternate drawing of the same symbol

## RC2512FK-0720KL
designator R?  Resistance: 20kΩ  (hidden comment: *)
Resistor, 20kΩ, ±1%, 1W, 200V, ±100ppm/℃, -55℃~+155℃, SMD 2512; Manufacturer: Uniroyal; Manufacturer Part Number: RC2512FK-0720KL; Supplier 1: LCSC; Supplier Part Number 1: C163342; JLCPCB Part Number: C163342; Power Rating: 1W; Category: Resistors; Package Size: 2512; JLCPCB Basic Part: Yes; Tolerance: ±1%; Voltage Rating: 200V; Temperature Coefficient: ±100ppm/℃; Temperature Rating: -55℃~+155℃; ComponentLink1Description: Datasheet; ComponentLink1URL: https://wmsc.lcsc.com/wmsc/upload/file/pdf/v2/lcsc/2304140030_YAGEO-RC2512FK-0720KL_C163342.pdf; ComponentLink2Description: JLCPCB Part URL; ComponentLink2URL: https://jlcpcb.com/partdetail/C163342
pins: 1, 2
1 alternate drawing of the same symbol

## RC2512FK-0720RL
designator R?  Resistance: 20Ω  (hidden comment: *)
Resistor, 20Ω, ±1%, 1W, 200V, ±100ppm/℃, -55℃~+155℃, SMD 2512; Manufacturer: Uniroyal; Manufacturer Part Number: RC2512FK-0720RL; Supplier 1: LCSC; Supplier Part Number 1: C309605; JLCPCB Part Number: C309605; Power Rating: 1W; Category: Resistors; Package Size: 2512; JLCPCB Basic Part: Yes; Tolerance: ±1%; Voltage Rating: 200V; Temperature Coefficient: ±100ppm/℃; Temperature Rating: -55℃~+155℃; ComponentLink1Description: Datasheet; ComponentLink1URL: https://wmsc.lcsc.com/wmsc/upload/file/pdf/v2/lcsc/2304140030_YAGEO-RC2512FK-0720RL_C309605.pdf; ComponentLink2Description: JLCPCB Part URL; ComponentLink2URL: https://jlcpcb.com/partdetail/C309605
pins: 1, 2
1 alternate drawing of the same symbol

## RC2512FK-0722KL
designator R?  Resistance: 22kΩ  (hidden comment: *)
Resistor, 22kΩ, ±1%, 1W, 200V, ±100ppm/℃, -55℃~+155℃, SMD 2512; Manufacturer: Uniroyal; Manufacturer Part Number: RC2512FK-0722KL; Supplier 1: LCSC; Supplier Part Number 1: C877866; JLCPCB Part Number: C877866; Power Rating: 1W; Category: Resistors; Package Size: 2512; JLCPCB Basic Part: Yes; Tolerance: ±1%; Voltage Rating: 200V; Temperature Coefficient: ±100ppm/℃; Temperature Rating: -55℃~+155℃; ComponentLink1Description: Datasheet; ComponentLink1URL: https://wmsc.lcsc.com/wmsc/upload/file/pdf/v2/lcsc/2112151030_YAGEO-RC2512FK-0722KL_C877866.pdf; ComponentLink2Description: JLCPCB Part URL; ComponentLink2URL: https://jlcpcb.com/partdetail/C877866
pins: 1, 2
1 alternate drawing of the same symbol

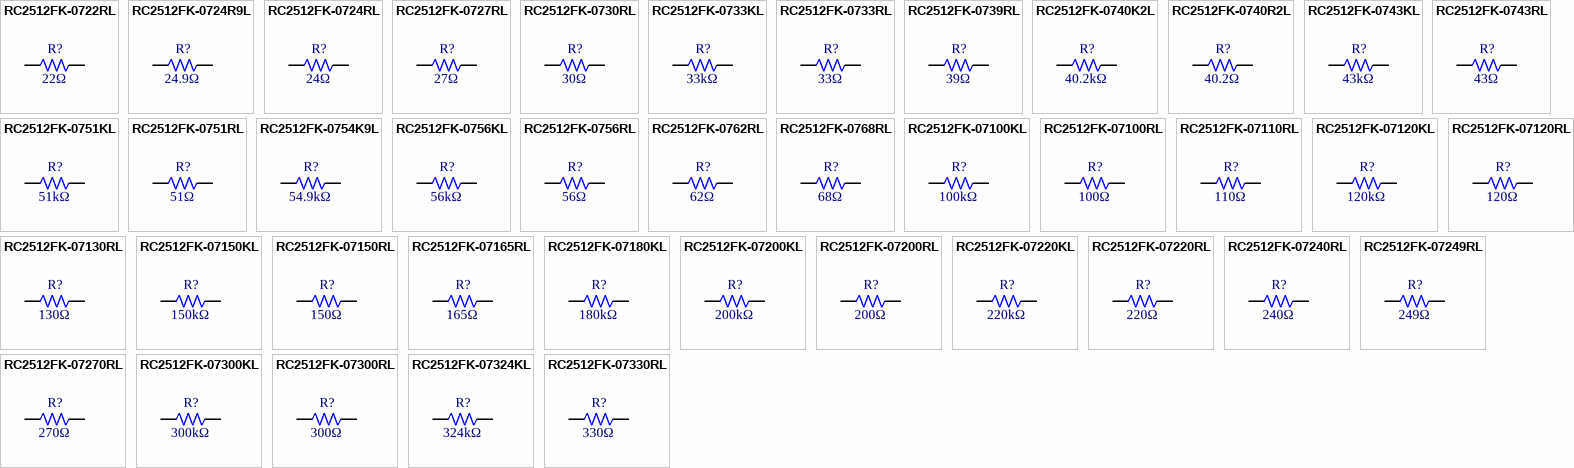
[diagram p43: symbols RC2512FK-0722RL to RC2512FK-07330RL]

## RC2512FK-0722RL
designator R?  Resistance: 22Ω  (hidden comment: *)
Resistor, 22Ω, ±1%, 1W, 200V, ±100ppm/℃, -55℃~+155℃, SMD 2512; Manufacturer: Uniroyal; Manufacturer Part Number: RC2512FK-0722RL; Supplier 1: LCSC; Supplier Part Number 1: C276336; JLCPCB Part Number: C276336; Power Rating: 1W; Category: Resistors; Package Size: 2512; JLCPCB Basic Part: Yes; Tolerance: ±1%; Voltage Rating: 200V; Temperature Coefficient: ±100ppm/℃; Temperature Rating: -55℃~+155℃; ComponentLink1Description: Datasheet; ComponentLink1URL: https://wmsc.lcsc.com/wmsc/upload/file/pdf/v2/lcsc/2304140030_YAGEO-RC2512FK-0722RL_C276336.pdf; ComponentLink2Description: JLCPCB Part URL; ComponentLink2URL: https://jlcpcb.com/partdetail/C276336
pins: 1, 2
1 alternate drawing of the same symbol

## RC2512FK-0724R9L
designator R?  Resistance: 24.9Ω  (hidden comment: *)
Resistor, 24.9Ω, ±1%, 1W, 200V, ±100ppm/℃, -55℃~+155℃, SMD 2512; Manufacturer: Uniroyal; Manufacturer Part Number: RC2512FK-0724R9L; Supplier 1: LCSC; Supplier Part Number 1: C877884; JLCPCB Part Number: C877884; Power Rating: 1W; Category: Resistors; Package Size: 2512; JLCPCB Basic Part: Yes; Tolerance: ±1%; Voltage Rating: 200V; Temperature Coefficient: ±100ppm/℃; Temperature Rating: -55℃~+155℃; ComponentLink1Description: Datasheet; ComponentLink1URL: https://wmsc.lcsc.com/wmsc/upload/file/pdf/v2/lcsc/2104150935_YAGEO-RC2512FK-0724R9L_C877884.pdf; ComponentLink2Description: JLCPCB Part URL; ComponentLink2URL: https://jlcpcb.com/partdetail/C877884
pins: 1, 2
1 alternate drawing of the same symbol

## RC2512FK-0724RL
designator R?  Resistance: 24Ω  (hidden comment: *)
Resistor, 24Ω, ±1%, 1W, 200V, ±100ppm/℃, -55℃~+155℃, SMD 2512; Manufacturer: Uniroyal; Manufacturer Part Number: RC2512FK-0724RL; Supplier 1: LCSC; Supplier Part Number 1: C877885; JLCPCB Part Number: C877885; Power Rating: 1W; Category: Resistors; Package Size: 2512; JLCPCB Basic Part: Yes; Tolerance: ±1%; Voltage Rating: 200V; Temperature Coefficient: ±100ppm/℃; Temperature Rating: -55℃~+155℃; ComponentLink1Description: Datasheet; ComponentLink1URL: https://wmsc.lcsc.com/wmsc/upload/file/pdf/v2/lcsc/2112131830_YAGEO-RC2512FK-0724RL_C877885.pdf; ComponentLink2Description: JLCPCB Part URL; ComponentLink2URL: https://jlcpcb.com/partdetail/C877885
pins: 1, 2
1 alternate drawing of the same symbol

## RC2512FK-0727RL
designator R?  Resistance: 27Ω  (hidden comment: *)
Resistor, 27Ω, ±1%, 1W, ±100ppm/℃, -55℃~+155℃, SMD 2512; Manufacturer: Uniroyal; Manufacturer Part Number: RC2512FK-0727RL; Supplier 1: LCSC; Supplier Part Number 1: C877905; JLCPCB Part Number: C877905; Power Rating: 1W; Category: Resistors; Package Size: 2512; JLCPCB Basic Part: Yes; Tolerance: ±1%; Temperature Coefficient: ±100ppm/℃; Temperature Rating: -55℃~+155℃; ComponentLink1Description: Datasheet; ComponentLink1URL: https://wmsc.lcsc.com/wmsc/upload/file/pdf/v2/lcsc/2311211102_YAGEO-RC2512FK-0727RL_C877905.pdf; ComponentLink2Description: JLCPCB Part URL; ComponentLink2URL: https://jlcpcb.com/partdetail/C877905
pins: 1, 2
1 alternate drawing of the same symbol

## RC2512FK-0730RL
designator R?  Resistance: 30Ω  (hidden comment: *)
Resistor, 30Ω, ±1%, 1W, 200V, ±100ppm/℃, -55℃~+155℃, SMD 2512; Manufacturer: Uniroyal; Manufacturer Part Number: RC2512FK-0730RL; Supplier 1: LCSC; Supplier Part Number 1: C309607; JLCPCB Part Number: C309607; Power Rating: 1W; Category: Resistors; Package Size: 2512; JLCPCB Basic Part: Yes; Tolerance: ±1%; Voltage Rating: 200V; Temperature Coefficient: ±100ppm/℃; Temperature Rating: -55℃~+155℃; ComponentLink1Description: Datasheet; ComponentLink1URL: https://wmsc.lcsc.com/wmsc/upload/file/pdf/v2/lcsc/2304140030_YAGEO-RC2512FK-0730RL_C309607.pdf; ComponentLink2Description: JLCPCB Part URL; ComponentLink2URL: https://jlcpcb.com/partdetail/C309607
pins: 1, 2
1 alternate drawing of the same symbol

## RC2512FK-0733KL
designator R?  Resistance: 33kΩ  (hidden comment: *)
Resistor, 33kΩ, ±1%, 1W, 200V, ±100ppm/℃, -55℃~+155℃, SMD 2512; Manufacturer: Uniroyal; Manufacturer Part Number: RC2512FK-0733KL; Supplier 1: LCSC; Supplier Part Number 1: C877969; JLCPCB Part Number: C877969; Power Rating: 1W; Category: Resistors; Package Size: 2512; JLCPCB Basic Part: Yes; Tolerance: ±1%; Voltage Rating: 200V; Temperature Coefficient: ±100ppm/℃; Temperature Rating: -55℃~+155℃; ComponentLink1Description: Datasheet; ComponentLink1URL: https://wmsc.lcsc.com/wmsc/upload/file/pdf/v2/lcsc/2202161030_YAGEO-RC2512FK-0733KL_C877969.pdf; ComponentLink2Description: JLCPCB Part URL; ComponentLink2URL: https://jlcpcb.com/partdetail/C877969
pins: 1, 2
1 alternate drawing of the same symbol

## RC2512FK-0733RL
designator R?  Resistance: 33Ω  (hidden comment: *)
Resistor, 33Ω, ±1%, 1W, 200V, ±100ppm/℃, -55℃~+155℃, SMD 2512; Manufacturer: Uniroyal; Manufacturer Part Number: RC2512FK-0733RL; Supplier 1: LCSC; Supplier Part Number 1: C513629; JLCPCB Part Number: C513629; Power Rating: 1W; Category: Resistors; Package Size: 2512; JLCPCB Basic Part: Yes; Tolerance: ±1%; Voltage Rating: 200V; Temperature Coefficient: ±100ppm/℃; Temperature Rating: -55℃~+155℃; ComponentLink1Description: Datasheet; ComponentLink1URL: https://wmsc.lcsc.com/wmsc/upload/file/pdf/v2/lcsc/2304140030_YAGEO-RC2512FK-0733RL_C513629.pdf; ComponentLink2Description: JLCPCB Part URL; ComponentLink2URL: https://jlcpcb.com/partdetail/C513629
pins: 1, 2
1 alternate drawing of the same symbol

## RC2512FK-0739RL
designator R?  Resistance: 39Ω  (hidden comment: *)
Resistor, 39Ω, ±1%, 1W, 200V, ±100ppm/℃, -55℃~+155℃, SMD 2512; Manufacturer: Uniroyal; Manufacturer Part Number: RC2512FK-0739RL; Supplier 1: LCSC; Supplier Part Number 1: C724015; JLCPCB Part Number: C724015; Power Rating: 1W; Category: Resistors; Package Size: 2512; JLCPCB Basic Part: Yes; Tolerance: ±1%; Voltage Rating: 200V; Temperature Coefficient: ±100ppm/℃; Temperature Rating: -55℃~+155℃; ComponentLink1Description: Datasheet; ComponentLink1URL: https://wmsc.lcsc.com/wmsc/upload/file/pdf/v2/lcsc/2009261810_YAGEO-RC2512FK-0739RL_C724015.pdf; ComponentLink2Description: JLCPCB Part URL; ComponentLink2URL: https://jlcpcb.com/partdetail/C724015
pins: 1, 2
1 alternate drawing of the same symbol

## RC2512FK-0740K2L
designator R?  Resistance: 40.2kΩ  (hidden comment: *)
Resistor, 40.2kΩ, ±1%, 1W, 200V, ±100ppm/℃, -55℃~+155℃, SMD 2512; Manufacturer: Uniroyal; Manufacturer Part Number: RC2512FK-0740K2L; Supplier 1: LCSC; Supplier Part Number 1: C723471; JLCPCB Part Number: C723471; Power Rating: 1W; Category: Resistors; Package Size: 2512; JLCPCB Basic Part: Yes; Tolerance: ±1%; Voltage Rating: 200V; Temperature Coefficient: ±100ppm/℃; Temperature Rating: -55℃~+155℃; ComponentLink1Description: Datasheet; ComponentLink1URL: https://wmsc.lcsc.com/wmsc/upload/file/pdf/v2/lcsc/2008201236_YAGEO-RC2512FK-0740K2L_C723471.pdf; ComponentLink2Description: JLCPCB Part URL; ComponentLink2URL: https://jlcpcb.com/partdetail/C723471
pins: 1, 2
1 alternate drawing of the same symbol

## RC2512FK-0740R2L
designator R?  Resistance: 40.2Ω  (hidden comment: *)
Resistor, 40.2Ω, ±1%, 1W, 200V, ±100ppm/℃, -55℃~+155℃, SMD 2512; Manufacturer: Uniroyal; Manufacturer Part Number: RC2512FK-0740R2L; Supplier 1: LCSC; Supplier Part Number 1: C878033; JLCPCB Part Number: C878033; Power Rating: 1W; Category: Resistors; Package Size: 2512; JLCPCB Basic Part: Yes; Tolerance: ±1%; Voltage Rating: 200V; Temperature Coefficient: ±100ppm/℃; Temperature Rating: -55℃~+155℃; ComponentLink1Description: Datasheet; ComponentLink1URL: https://wmsc.lcsc.com/wmsc/upload/file/pdf/v2/lcsc/2112231430_YAGEO-RC2512FK-0740R2L_C878033.pdf; ComponentLink2Description: JLCPCB Part URL; ComponentLink2URL: https://jlcpcb.com/partdetail/C878033
pins: 1, 2
1 alternate drawing of the same symbol

## RC2512FK-0743KL
designator R?  Resistance: 43kΩ  (hidden comment: *)
Resistor, 43kΩ, ±1%, 1W, 200V, ±100ppm/℃, -55℃~+155℃, SMD 2512; Manufacturer: Uniroyal; Manufacturer Part Number: RC2512FK-0743KL; Supplier 1: LCSC; Supplier Part Number 1: C326619; JLCPCB Part Number: C326619; Power Rating: 1W; Category: Resistors; Package Size: 2512; JLCPCB Basic Part: Yes; Tolerance: ±1%; Voltage Rating: 200V; Temperature Coefficient: ±100ppm/℃; Temperature Rating: -55℃~+155℃; ComponentLink1Description: Datasheet; ComponentLink1URL: https://wmsc.lcsc.com/wmsc/upload/file/pdf/v2/lcsc/1811141450_YAGEO-RC2512FK-0743KL_C326619.pdf; ComponentLink2Description: JLCPCB Part URL; ComponentLink2URL: https://jlcpcb.com/partdetail/C326619
pins: 1, 2
1 alternate drawing of the same symbol

## RC2512FK-0743RL
designator R?  Resistance: 43Ω  (hidden comment: *)
Resistor, 43Ω, ±1%, 1W, 200V, ±100ppm/℃, -55℃~+155℃, SMD 2512; Manufacturer: Uniroyal; Manufacturer Part Number: RC2512FK-0743RL; Supplier 1: LCSC; Supplier Part Number 1: C878048; JLCPCB Part Number: C878048; Power Rating: 1W; Category: Resistors; Package Size: 2512; JLCPCB Basic Part: Yes; Tolerance: ±1%; Voltage Rating: 200V; Temperature Coefficient: ±100ppm/℃; Temperature Rating: -55℃~+155℃; ComponentLink1Description: Datasheet; ComponentLink1URL: https://wmsc.lcsc.com/wmsc/upload/file/pdf/v2/lcsc/2112131830_YAGEO-RC2512FK-0743RL_C878048.pdf; ComponentLink2Description: JLCPCB Part URL; ComponentLink2URL: https://jlcpcb.com/partdetail/C878048
pins: 1, 2
1 alternate drawing of the same symbol
